# Altium footprint library MPBoard.PcbLib: 123 footprints (part 5 of 8)
Each footprint in its own frame and in the unit in brackets; x right, y up, seen from the top. Pads: shape width x height; smd on the part's side, far side on the other; paste and mask are expansions set on the pad; w line width, h text height; cw(c..) or ccw(c..) is an arc to the next point about the centre after c.
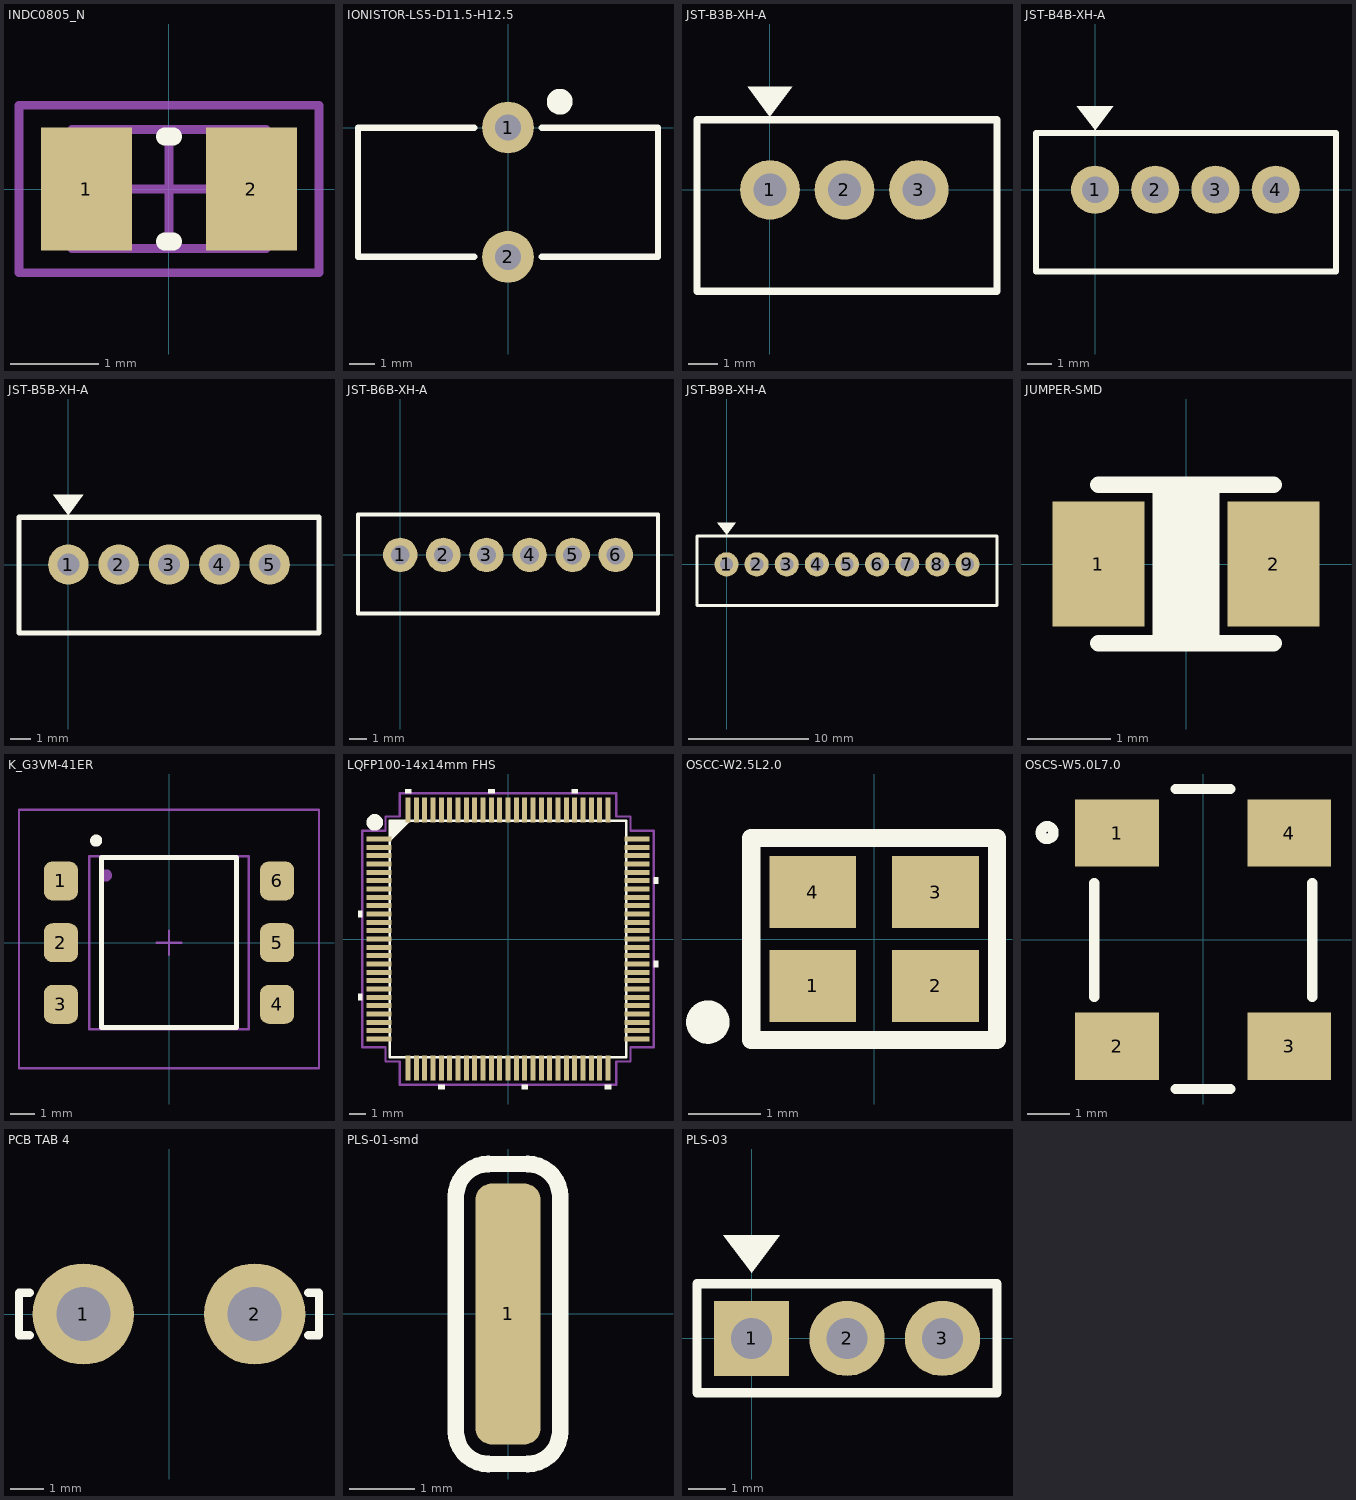
[diagram p4: the footprints below, top view; thin cyan lines are the x and y axes]

## INDC0805_N [mm] "Chip Inductor, 2-Leads, Body 2,00x1,25mm, IPC Medium Density"
height 0.7
pads (2):
  rect 1.03x1.39 smd: 1(-0.935,0) 2(0.935,0)
Top Overlay:
  lines w0.2: -0.05,-0.595 0.05,-0.595 ; -0.05,0.595 0.05,0.595
Top Component Outline:
  lines w0.1: -1.1,-0.675 1.1,-0.675 1.1,0.675 -1.1,0.675 -1.1,-0.675
Top Courtyard:
  lines w0.1: -0.5,0 0.5,0 ; 0,-0.5 0,0.5 ; -1.7,-0.95 1.7,-0.95 1.7,0.95 -1.7,0.95 -1.7,-0.95
3D body: height 0.7, standoff 0, extent -0.7,-0.675 0.7,0.675
3D body: height 0.7, standoff 0, extent -1.1,-0.675 -0.7,0.675
3D body: height 0.7, standoff 0, extent 0.7,-0.675 1.1,0.675

## IONISTOR-LS5-D11.5-H12.5 [mm]
pads (2):
  round 2 hole 1: 1(0,0) 2(0,-5)
Top Overlay:
  lines w0.25: -1.3,-5 -5.8,-5 -5.8,0 -1.3,0 ; 1.3,-5 5.8,-5 5.8,0 1.3,0
  lines w0.5: 2.245,0.952 cw(c2,1) 2.25,1
3D body "ionistor_ls5_d12_h13.stp": height 12.85, standoff -2.4, extent -5.75,-5.1 5.75,0.1

## JST-B3B-XH-A [mm]
pads (3):
  round 2 hole 1.1: 1(0,0) 2(2.5,0) 3(5,0)
Top Overlay:
  region: 0.75,3.457 0,2.457 -0.75,3.457
  lines w0.25: -2.45,-3.4 -2.45,2.35 7.62,2.35 7.62,-3.4 -2.45,-3.4
3D body "B3B-XH-A.STEP": height 7.1, standoff -3.3, extent -2.45,-3.375 7.45,2.375

## JST-B4B-XH-A [mm]
pads (4):
  round 2 hole 1.1: 1(0,0) 2(2.5,0) 3(5,0) 4(7.5,0)
Top Overlay:
  region: 0.75,3.457 0,2.457 -0.75,3.457
  lines w0.25: -2.45,-3.4 -2.45,2.35 10,2.35 10,-3.4 -2.45,-3.4
3D body "B4B-XH-A.STEP": height 7, standoff -3.4, extent -2.45,-3.4 9.95,2.35

## JST-B5B-XH-A [mm]
pads (5):
  round 2 hole 1.1: 1(0,0) 2(2.5,0) 3(5,0) 4(7.5,0) 5(10,0)
Top Overlay:
  region: 0.75,3.457 0,2.457 -0.75,3.457
  lines w0.25: -2.45,-3.4 -2.45,2.35 12.45,2.35 12.45,-3.4 -2.45,-3.4
3D body "B5B-XH-A.STEP": height 7, standoff -3.4, extent -2.45,-3.4 12.45,2.35

## JST-B6B-XH-A [mm]
height 1.3
pads (6):
  round 2 hole 1.1: 1(0,0) 2(2.5,0) 3(5,0) 4(7.5,0) 5(10,0) 6(12.5,0)
Top Overlay:
  lines w0.25: -2.45,-3.4 14.95,-3.4 14.95,2.35 -2.45,2.35 -2.45,-3.4
3D body "B6B-XH-A.STEP": height 7, standoff -3.4, extent -2.45,-3.4 14.95,2.35

## JST-B9B-XH-A [mm]
pads (9):
  round 2 hole 1.1: 1(0,0) 2(2.5,0) 3(5,0) 4(7.5,0) 5(10,0) 6(12.5,0) 7(15,0) 8(17.5,0) 9(20,0)
Top Overlay:
  region: 0.75,3.457 0,2.457 -0.75,3.457
  lines w0.25: -2.45,-3.4 22.45,-3.4 22.45,2.35 -2.45,2.35 -2.45,-3.4
3D body "B9B-XH-A.STEP": height 7.02, standoff -3.38, extent -2.45,-3.4 22.45,2.35

## JUMPER-SMD [mm]
height 15
pads (2):
  rect 1.1x1.5 smd: 1(-1.05,0) 2(1.05,0)
Top Overlay:
  rectangle: -0.4,-0.95 0.4,0.95
  lines w0.2: -1.05,-0.95 1.05,-0.95 ; -1.05,0.95 1.05,0.95
3D body "prt0001.stp": height 0.7, standoff 0, extent -1.3,-0.7 1.3,0.7

## K_G3VM-41ER [mm]
height 4.85
pads (6):
  rrect50% 1.4x1.6 smd: 1(-4.45,2.54) 2(-4.45,0) 3(-4.45,-2.54) 4(4.45,-2.54) 5(4.45,0) 6(4.45,2.54)
Top Overlay:
  circle w0.25: c-3,4.2 r0.125
  lines w0.2: -2.775,-3.5 2.775,-3.5 2.775,3.5 -2.775,3.5 -2.775,-3.5
Top Component Outline:
  circle w0.3: c-2.6,2.77 r0.1
  lines w0.1: -3.275,-3.56 3.275,-3.56 3.275,3.56 -3.275,3.56 -3.275,-3.56
Top Courtyard:
  lines w0.1: -0.5,0 0.5,0 ; 0,-0.5 0,0.5 ; -6.175,-5.175 6.175,-5.175 6.175,5.475 -6.175,5.475 -6.175,-5.175
3D body "G3VM_41ER.step": height 4, standoff 0, extent -5,-3.56 5,3.56

## LQFP100-14x14mm FHS [mm] "For Hand Solder"
pads (100):
  rect 1.5x0.3 smd paste+0 mask+0: 1(-7.75,6) 2(-7.75,5.5) 3(-7.75,5) 4(-7.75,4.5) 5(-7.75,4) 6(-7.75,3.5) 7(-7.75,3) 8(-7.75,2.5) 9(-7.75,2) 10(-7.75,1.5) 11(-7.75,1) 12(-7.75,0.5) 13(-7.75,0) 14(-7.75,-0.5) 15(-7.75,-1) 16(-7.75,-1.5) 17(-7.75,-2) 18(-7.75,-2.5) 19(-7.75,-3) 20(-7.75,-3.5) 21(-7.75,-4) 22(-7.75,-4.5) 23(-7.75,-5) 24(-7.75,-5.5) 25(-7.75,-6) 51(7.75,-6) 52(7.75,-5.5) 53(7.75,-5) 54(7.75,-4.5) 55(7.75,-4) 56(7.75,-3.5) 57(7.75,-3) 58(7.75,-2.5) 59(7.75,-2) 60(7.75,-1.5) 61(7.75,-1) 62(7.75,-0.5) 63(7.75,0) 64(7.75,0.5) 65(7.75,1) 66(7.75,1.5) 67(7.75,2) 68(7.75,2.5) 69(7.75,3) 70(7.75,3.5) 71(7.75,4) 72(7.75,4.5) 73(7.75,5) 74(7.75,5.5) 75(7.75,6)
  rect 0.3x1.5 smd paste+0 mask+0: 26(-6,-7.75) 27(-5.5,-7.75) 28(-5,-7.75) 29(-4.5,-7.75) 30(-4,-7.75) 31(-3.5,-7.75) 32(-3,-7.75) 33(-2.5,-7.75) 34(-2,-7.75) 35(-1.5,-7.75) 36(-1,-7.75) 37(-0.5,-7.75) 38(0,-7.75) 39(0.5,-7.75) 40(1,-7.75) 41(1.5,-7.75) 42(2,-7.75) 43(2.5,-7.75) 44(3,-7.75) 45(3.5,-7.75) 46(4,-7.75) 47(4.5,-7.75) 48(5,-7.75) 49(5.5,-7.75) 50(6,-7.75) 76(6,7.75) 77(5.5,7.75) 78(5,7.75) 79(4.5,7.75) 80(4,7.75) 81(3.5,7.75) 82(3,7.75) 83(2.5,7.75) 84(2,7.75) 85(1.5,7.75) 86(1,7.75) 87(0.5,7.75) 88(0,7.75) 89(-0.5,7.75) 90(-1,7.75) 91(-1.5,7.75) 92(-2,7.75) 93(-2.5,7.75) 94(-3,7.75) 95(-3.5,7.75) 96(-4,7.75) 97(-4.5,7.75) 98(-5,7.75) 99(-5.5,7.75) 100(-6,7.75)
Top Overlay:
  circle w0.5: c-8,7 r0.25
  region: 6.2,-8.75 5.819,-8.75 5.819,-9.004 6.2,-9.004
  region: 8.75,-1.3 9.004,-1.3 9.004,-1.681 8.75,-1.681
  region: 8.75,3.7 9.004,3.7 9.004,3.319 8.75,3.319
  region: 4.2,8.75 3.819,8.75 3.819,9.004 4.2,9.004
  region: -0.8,8.75 -1.181,8.75 -1.181,9.004 -0.8,9.004
  region: -5.8,8.75 -6.181,8.75 -6.181,9.004 -5.8,9.004
  region: -8.75,1.7 -9.004,1.7 -9.004,1.319 -8.75,1.319
  region: -8.75,-3.3 -9.004,-3.3 -9.004,-3.681 -8.75,-3.681
  region: -3.8,-8.75 -4.181,-8.75 -4.181,-9.004 -3.8,-9.004
  region: 1.2,-8.75 0.819,-8.75 0.819,-9.004 1.2,-9.004
  region: -7.112,5.842 -5.842,7.112 -7.112,7.112
  lines w0.15: -7.099,-7.099 7.099,-7.099 7.099,7.112 -7.099,7.112 -7.099,-7.099
Mechanical 15:
  lines w0.15: -8.763,-6.508 -8.763,6.508 -7.353,6.508 -7.353,7.353 -6.508,7.353 -6.508,8.763 6.508,8.763 6.508,7.353 7.353,7.353 7.353,6.508 8.763,6.508 8.763,-6.508 7.353,-6.508 7.353,-7.353 6.508,-7.353 6.508,-8.763 -6.508,-8.763 -6.508,-7.353 -7.353,-7.353 -7.353,-6.508 -8.763,-6.508
3D body "LQFP100-14x14mm.step": height 1.6, standoff 0, extent -7.997,-7.997 7.997,7.997

## OSCC-W2.5L2.0 [mm]
pads (4):
  rect 1.2x1 smd: 1(-0.85,-0.65) 2(0.85,-0.65) 3(0.85,0.65) 4(-0.85,0.65)
Top Overlay:
  circle w0.3: c-2.3,-1.15 r0.15
  lines w0.25: -1.7,-1.4 1.7,-1.4 1.7,1.4 -1.7,1.4 -1.7,-1.4
3D body "OSCC-W2.5L2.0.STEP": height 0.55, standoff 0, extent -1.25,-1 1.25,1

## OSCS-W5.0L7.0 [mm]
pads (4):
  rect 2x1.6 smd: 1(-2.05,2.54) 2(-2.05,-2.54) 3(2.05,-2.54) 4(2.05,2.54)
Top Overlay:
  circle w0.25: c-3.72,2.55 r0.15
  lines w0.25: -2.6,-1.36 -2.6,1.34 ; -0.65,-3.56 0.65,-3.56 ; -0.65,3.59 0.65,3.59 ; 2.6,-1.36 2.6,1.34
3D body "OSCS-W5.0L7.0.STEP": height 1.8, standoff 0, extent -2.5,-3.5 2.5,3.5

## PCB TAB 4 [mm]
pads (2):
  round 3 hole 1.6: 1(-2.54,0) 2(2.54,0)
Top Overlay:
  lines w0.25: -4.127,-0.635 -4.445,-0.635 -4.445,0.635 -4.127,0.635 ; 4.127,-0.635 4.445,-0.635 4.445,0.635 4.127,0.635
3D body "pcb_tab_3.stp": height 12.7, standoff -5.8, extent -4.4,-0.4 4.4,0.4

## PCBComponent_1 [mm]

## PLS-01-smd [mm]
pads (1):
  rrect50% 1x4 smd: 1(0,0)
Top Overlay:
  lines w0.25: -0.8,-1.8 -0.8,1.8 ; -0.3,-2.3 0.3,-2.3 ; -0.3,2.3 0.3,2.3 ; 0.8,-1.8 0.8,1.8
  lines w0.254: -0.8,-1.8 ccw(c-0.3,-1.8) -0.3,-2.3 ; -0.8,1.8 cw(c-0.3,1.8) -0.3,2.3 ; 0.3,-2.3 ccw(c0.3,-1.8) 0.8,-1.8 ; 0.3,2.3 cw(c0.3,1.8) 0.8,1.8

## PLS-03 [mm]
pads (3):
  rect 2x2 hole 1.1: 1(0,0)
  round 2 hole 1.1: 2(2.54,0) 3(5.08,0)
Top Overlay:
  region: 0.75,2.75 0,1.75 -0.75,2.75
  lines w0.25: -1.45,-1.45 6.53,-1.45 6.53,1.45 -1.45,1.45 -1.45,-1.45
3D body "PLS-03.STEP": height 8.38, standoff -3.81, extent -1.27,-1.27 6.35,1.27